# Altium footprint library Connectors SMD.PcbLib: 130 footprints (part 1 of 12)
Each footprint in its own frame and in the unit in brackets; x right, y up, seen from the top. Pads: shape width x height; smd on the part's side, far side on the other; paste and mask are expansions set on the pad; w line width, h text height; cw(c..) or ccw(c..) is an arc to the next point about the centre after c.
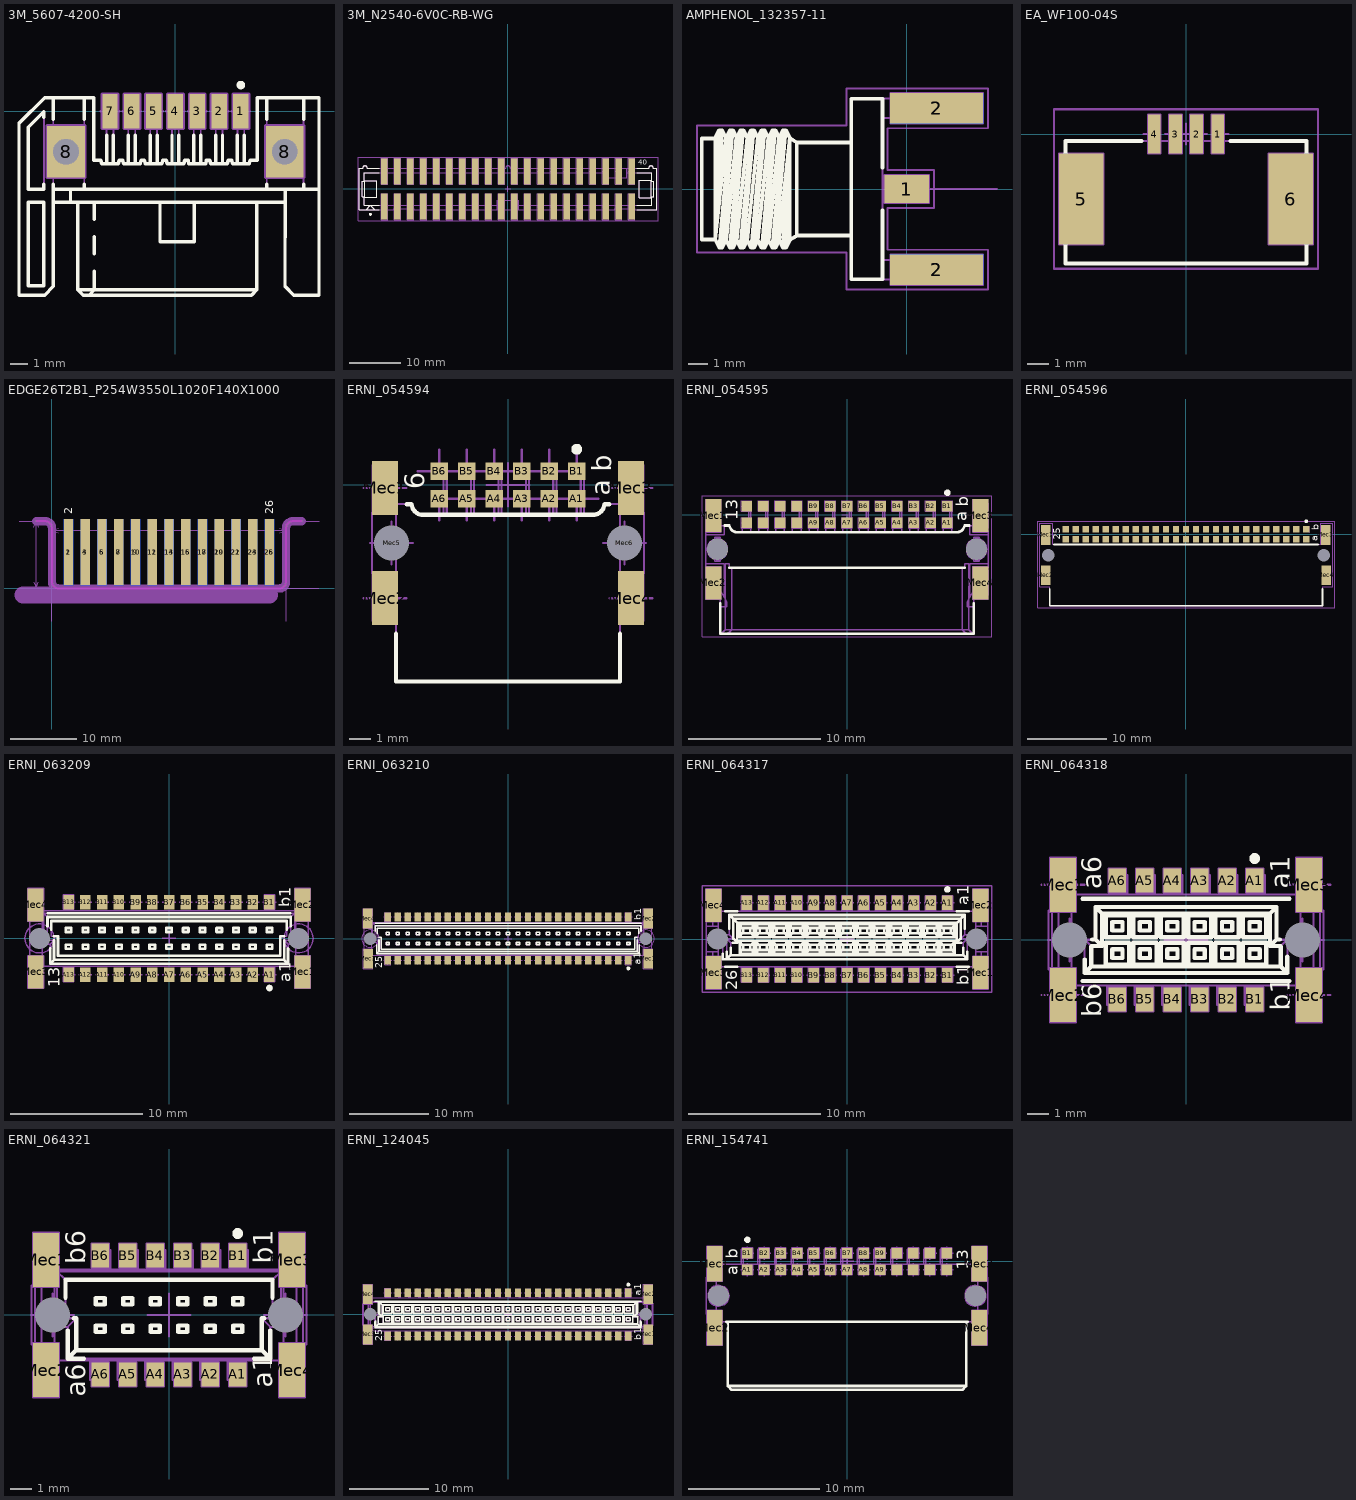
[diagram p0: the footprints below, top view; thin cyan lines are the x and y axes]

## 3M_5607-4200-SH [mm] "1.27mm (.050\") Pitch, Surface Mount, Right Angle, Serial ATA Plug (SATA)"
height 4
pads (9):
  rect 0.9x2 smd: 1(3.81,0) 2(2.54,0) 3(1.27,0) 4(0,0) 5(-1.27,0) 6(-2.54,0) 7(-3.81,0)
  rect 2.2x3 hole 1.5: 8(-6.37,-2.36) 8(6.37,-2.36)
Top Overlay:
  circle w0.25: c3.81,1.516 r0.125
  lines w0.2: -7.66,-4.25 -7.66,-4.559 -8.56,-4.559 -8.56,-0.937 -7.66,-0.037 -7.66,-0.346 ; -7.11,-5.309 6.38,-5.309 ; -7.11,-4.559 8.36,-4.559 ; -7.11,-4.26 -7.11,-10.209 -7.61,-10.709 -9.11,-10.709 -9.11,-0.709 -7.61,0.791 -4.76,0.791 -4.76,-2.859 -4.345,-2.859 -4.296,-3.059 -3.324,-3.059 -3.275,-2.859 -3.075,-2.859 -3.026,-3.059 -2.054,-3.059 -2.005,-2.859 -1.805,-2.859 -1.756,-3.059 -0.784,-3.059 -0.735,-2.859 -0.535,-2.859 -0.486,-3.059 0.486,-3.059 0.535,-2.859 0.735,-2.859 0.784,-3.059 1.756,-3.059 1.805,-2.859 2.005,-2.859 2.054,-3.059 3.026,-3.059 3.075,-2.859 3.275,-2.859 3.324,-3.059 4.296,-3.059 4.345,-2.859 4.76,-2.859 4.76,0.791 8.36,0.791 8.36,-10.709 6.88,-10.709 6.38,-10.209 6.382,-4.569 ; -7.11,-0.46 -7.11,0.791 ; -6.11,-5.309 -6.11,-4.559 ; -5.68,-5.309 -5.68,-10.409 ; -5.31,-4.559 -5.31,-4.26 ; -5.31,-0.46 -5.31,0.791 ; -5.019,-10.709 -4.719,-10.409 -4.719,-9.309 ; -4.719,-8.309 -4.719,-7.309 ; -4.719,-6.309 -4.719,-5.309 ; -4.01,-3.059 -4.01,-1.4 ; -3.61,-3.059 -3.61,-1.4 ; -2.74,-3.059 -2.74,-1.4 ; -2.34,-3.059 -2.34,-1.4 ; -1.47,-3.059 -1.47,-1.4 ; -1.07,-3.059 -1.07,-1.4 ; -0.9,-5.309 -0.9,-7.609 1.1,-7.609 1.1,-5.309 ; -0.2,-3.059 -0.2,-1.4 ; 0.2,-3.059 0.2,-1.4 ; 1.07,-3.059 1.07,-1.4 ; 1.47,-3.059 1.47,-1.4 ; 2.34,-3.059 2.34,-1.4 ; 2.74,-3.059 2.74,-1.4 ; 3.61,-3.059 3.61,-1.4 ; 4.01,-3.059 4.01,-1.4 ; 4.73,-5.309 4.73,-10.409 ; 5.31,-4.559 5.31,-4.26 ; 5.31,-0.46 5.31,0.791 ; 7.46,-4.559 7.46,-4.26 ; 7.46,-0.46 7.46,0.791 ; -5.68,-10.409 -5.38,-10.709 4.43,-10.709 4.73,-10.409 ; -5.68,-10.409 4.73,-10.409 ; -8.56,-10.159 -7.66,-10.159 -7.66,-5.309 -8.56,-5.309 -8.56,-10.159
Mechanical 8:
  circle w0.1: c-6.37,-2.36 r0.75
  circle w0.1: c6.37,-2.36 r0.75
  lines w0.2: -6.87,-2.36 -6.37,-2.36 ; -6.37,-2.86 -6.37,-2.36 ; -6.37,-1.86 -6.37,-2.36 ; -5.87,-2.36 -6.37,-2.36 ; -4.31,0 -3.81,0 ; -3.81,-0.5 -3.81,0 ; -3.81,0.5 -3.81,0 ; -3.31,0 -3.81,0 ; -3.04,0 -2.54,0 ; -2.54,-0.5 -2.54,0 ; -2.54,0.5 -2.54,0 ; -2.04,0 -2.54,0 ; -1.77,0 -1.27,0 ; -1.27,-0.5 -1.27,0 ; -1.27,0.5 -1.27,0 ; -0.77,0 -1.27,0 ; -0.5,0 0,0 ; 0,-0.5 0,0 ; 0,0.5 0,0 ; 0.5,0 0,0 ; 0.77,0 1.27,0 ; 1.27,-0.5 1.27,0 ; 1.27,0.5 1.27,0 ; 1.77,0 1.27,0 ; 2.04,0 2.54,0 ; 2.54,-0.5 2.54,0 ; 2.54,0.5 2.54,0 ; 3.04,0 2.54,0 ; 3.31,0 3.81,0 ; 3.81,-0.5 3.81,0 ; 3.81,0.5 3.81,0 ; 4.31,0 3.81,0 ; 5.87,-2.36 6.37,-2.36 ; 6.37,-2.86 6.37,-2.36 ; 6.37,-1.86 6.37,-2.36 ; 6.87,-2.36 6.37,-2.36 ; -7.47,-3.86 -7.47,-0.86 -5.27,-0.86 -5.27,-3.86 -7.47,-3.86 ; -4.26,-1 -4.26,1 -3.36,1 -3.36,-1 -4.26,-1 ; -2.99,-1 -2.99,1 -2.09,1 -2.09,-1 -2.99,-1 ; -1.72,-1 -1.72,1 -0.82,1 -0.82,-1 -1.72,-1 ; -0.45,-1 -0.45,1 0.45,1 0.45,-1 -0.45,-1 ; 0.82,-1 0.82,1 1.72,1 1.72,-1 0.82,-1 ; 2.09,-1 2.09,1 2.99,1 2.99,-1 2.09,-1 ; 3.36,-1 3.36,1 4.26,1 4.26,-1 3.36,-1 ; 5.27,-3.86 5.27,-0.86 7.47,-0.86 7.47,-3.86 5.27,-3.86
Mechanical 14:
  lines w0.1: -7.11,-5.309 6.38,-5.309 ; -7.11,-4.559 8.36,-4.559 ; -7.11,0.791 -7.11,-10.209 -7.61,-10.709 -9.11,-10.709 -9.11,-0.709 -7.61,0.791 -4.76,0.791 -4.76,-2.859 -4.345,-2.859 -4.296,-3.059 -3.324,-3.059 -3.275,-2.859 -3.075,-2.859 -3.026,-3.059 -2.054,-3.059 -2.005,-2.859 -1.805,-2.859 -1.756,-3.059 -0.784,-3.059 -0.735,-2.859 -0.535,-2.859 -0.486,-3.059 0.486,-3.059 0.535,-2.859 0.735,-2.859 0.784,-3.059 1.756,-3.059 1.805,-2.859 2.005,-2.859 2.054,-3.059 3.026,-3.059 3.075,-2.859 3.275,-2.859 3.324,-3.059 4.296,-3.059 4.345,-2.859 4.76,-2.859 4.76,0.791 8.36,0.791 8.36,-10.709 6.88,-10.709 6.38,-10.209 6.382,-4.569 ; -6.11,-5.309 -6.11,-4.559 ; -5.68,-5.309 -5.68,-10.409 ; -5.31,-4.559 -5.31,0.791 ; -5.019,-10.709 -4.719,-10.409 -4.719,-9.309 ; -4.719,-8.309 -4.719,-7.309 ; -4.719,-6.309 -4.719,-5.309 ; -4.01,-3.059 -4.01,0.591 -3.61,0.591 -3.61,-3.059 ; -2.74,-3.059 -2.74,0.591 -2.34,0.591 -2.34,-3.059 ; -1.47,-3.059 -1.47,0.591 -1.07,0.591 -1.07,-3.059 ; -0.9,-5.309 -0.9,-7.609 1.1,-7.609 1.1,-5.309 ; -0.2,-3.059 -0.2,0.591 0.2,0.591 0.2,-3.059 ; 1.07,-3.059 1.07,0.591 1.47,0.591 1.47,-3.059 ; 2.34,-3.059 2.34,0.591 2.74,0.591 2.74,-3.059 ; 3.61,-3.059 3.61,0.591 4.01,0.591 4.01,-3.059 ; 4.73,-5.309 4.73,-10.409 ; 5.31,-4.559 5.31,0.791 ; 7.46,-4.559 7.46,0.791 ; -5.68,-10.409 -5.38,-10.709 4.43,-10.709 4.73,-10.409 ; -5.68,-10.409 4.73,-10.409 ; -8.56,-10.159 -7.66,-10.159 -7.66,-5.309 -8.56,-5.309 -8.56,-10.159 ; -8.56,-4.559 -7.66,-4.559 -7.66,-0.037 -8.56,-0.937 -8.56,-4.559 ; -6.52,-3.535 -6.22,-3.535 -6.22,-1.177 -6.52,-1.177 -6.52,-3.535 ; 6.22,-3.535 6.52,-3.535 6.52,-1.177 6.22,-1.177 6.22,-3.535
3D body: height 4, standoff -2.7, extent -9.11,-10.709 8.36,0.791

## 3M_N2540-6V0C-RB-WG [mm] "40 Contacts - Straight SMD .100\" x .100\" Low Profile Four-Wall Header"
height 10.16
pads (40):
  rect 1.27x5.08 smd: 1(-24.13,-3.43) 2(-24.13,3.43) 3(-21.59,-3.43) 4(-21.59,3.43) 5(-19.05,-3.43) 6(-19.05,3.43) 7(-16.51,-3.43) 8(-16.51,3.43) 9(-13.97,-3.43) 10(-13.97,3.43) 11(-11.43,-3.43) 12(-11.43,3.43) 13(-8.89,-3.43) 14(-8.89,3.43) 15(-6.35,-3.43) 16(-6.35,3.43) 17(-3.81,-3.43) 18(-3.81,3.43) 19(-1.27,-3.43) 20(-1.27,3.43) 21(1.27,-3.43) 22(1.27,3.43) 23(3.81,-3.43) 24(3.81,3.43) 25(6.35,-3.43) 26(6.35,3.43) 27(8.89,-3.43) 28(8.89,3.43) 29(11.43,-3.43) 30(11.43,3.43) 31(13.97,-3.43) 32(13.97,3.43) 33(16.51,-3.43) 34(16.51,3.43) 35(19.05,-3.43) 36(19.05,3.43) 37(21.59,-3.43) 38(21.59,3.43) 39(24.13,-3.43) 40(24.13,3.43)
Top Overlay:
  circle w0.3: c-26.88,-4.949 r0.15
  lines w0.2: -28.042,-1.599 -25.629,-1.599 -25.629,1.599 -28.042,1.599 ; -27.94,-1.629 -27.94,1.629 ; -27.744,-4.064 -26.88,-3.2 -26.016,-4.064 ; -25.165,-4.064 -29.058,-4.064 -29.058,4.064 -28.397,4.064 cw(c-27.94,4.064) -27.483,4.064 -25.165,4.064 ; -25.165,-3.175 -28.042,-3.175 -28.042,-1.475 -28.448,-1.475 -28.448,1.475 -28.042,1.475 -28.042,3.175 -25.165,3.175 ; 25.165,-4.064 29.058,-4.064 29.058,4.064 28.397,4.064 ccw(c27.94,4.064) 27.483,4.064 25.165,4.064 ; 25.165,-3.175 28.042,-3.175 28.042,-1.524 28.448,-1.524 28.448,1.524 28.042,1.524 28.042,3.175 25.165,3.175 ; 27.94,-1.645 28.042,-1.631 ; 27.94,1.645 28.042,1.631 ; 25.629,-1.664 25.629,1.664 27.94,1.664 27.94,-1.664 25.629,-1.664
  text "40" at 25.453,4.767 h1.02
Mechanical 8:
  drawing of 324 lines, arcs and shapes, not listed
Mechanical 14:
  lines w0.1: -28.042,-1.599 -25.629,-1.599 -25.629,1.599 -28.042,1.599 ; -27.94,-1.629 -27.94,1.629 ; -27.744,-4.064 -26.88,-3.2 -26.016,-4.064 ; -3.365,-4.064 -3.365,-3.175 ; -2.095,-4.064 -2.095,-2.159 2.096,-2.159 2.096,-4.064 ; -2.095,-3.175 -28.042,-3.175 -28.042,-1.475 -28.448,-1.475 -28.448,1.475 -28.042,1.475 -28.042,3.175 18.979,3.175 18.987,3.175 ; -1.46,-4.064 -1.46,-2.159 ; 1.461,-4.064 1.461,-2.159 ; 2.096,-3.175 28.042,-3.175 28.042,-1.524 28.448,-1.524 28.448,1.524 28.042,1.524 28.042,3.175 23.178,3.175 ; 3.366,-4.064 3.366,-3.175 ; 18.987,4.064 18.987,2.159 23.178,2.159 23.178,4.064 ; 19.622,2.159 19.622,4.064 ; 24.448,3.175 24.448,4.064 ; 27.94,-1.645 28.042,-1.631 ; 27.94,1.645 28.042,1.631 ; -29.058,-4.064 -22.352,-4.064 -22.352,-3.81 -18.288,-3.81 -18.288,-4.064 20.828,-4.064 20.828,-3.81 24.892,-3.81 24.892,-4.064 29.058,-4.064 29.058,4.064 28.397,4.064 ccw(c27.94,4.064) 27.483,4.064 14.427,4.064 ccw(c13.97,4.064) 13.513,4.064 0.457,4.064 ccw(c0,4.064) -0.457,4.064 -13.513,4.064 ccw(c-13.97,4.064) -14.427,4.064 -27.483,4.064 ccw(c-27.94,4.064) -28.397,4.064 -29.058,4.064 -29.058,-4.064 ; 25.629,-1.664 25.629,1.664 27.94,1.664 27.94,-1.664 25.629,-1.664
  text "40" at 25.453,4.767 h1.02
Mechanical 15:
  lines w0.05: -29.308,-6.22 -29.308,6.22 29.308,6.22 29.308,-6.22 -29.308,-6.22
3D body: height 10.16, standoff 0, extent -29.057,-5.588 29.058,5.588

## AMPHENOL_132357-11 [mm] "SMA End Launch Jack for 1.58mm PCB, 50 Ohm, Flat Tab Contact"
height 7.92
pads (5):
  rect 2.35x1.5 smd: 1(0,0)
  rect 4.9x1.6 smd: 2(1.575,-4.25) 2(1.575,4.25)
  rect 4.9x1.6 smd far side: 2(1.575,-4.25) 2(1.575,4.25)
Top Overlay:
  lines w0.2: -10.09,2.665 -10.805,2.665 -10.805,-2.665 -10.09,-2.665 ; -6.17,-2.665 -5.795,-2.453 ; -2.925,-2.453 -5.795,-2.453 ; -2.925,2.447 -5.795,2.447 ; -1.275,-1.137 -1.275,-4.76 -2.925,-4.76 -2.925,4.76 -1.275,4.76 -1.275,1.137 ; -10.09,-2.665 -9.879,3.094 ; -10.09,-2.665 -9.741,3.094 ; -10.09,-2.665 -9.53,2.715 ; -10.09,-2.665 -9.879,-3.094 ; -10.09,-2.665 -10.09,2.715 -9.879,3.094 ; -9.879,-3.094 -9.319,3.094 ; -9.879,-3.094 -9.741,-3.094 ; -9.879,3.094 -9.741,3.094 ; -9.741,-3.094 -9.181,3.094 ; -9.741,-3.094 -9.53,-2.715 ; -9.741,3.094 -9.53,2.715 ; -9.53,-2.715 -8.97,2.715 ; -9.53,-2.715 -9.319,-3.094 ; -9.53,2.715 -9.319,3.094 ; -9.319,-3.094 -8.759,3.094 ; -9.319,-3.094 -9.181,-3.094 ; -9.319,3.094 -9.181,3.094 ; -9.181,-3.094 -8.621,3.094 ; -9.181,-3.094 -8.97,-2.715 ; -9.181,3.094 -8.97,2.715 ; -8.97,-2.715 -8.41,2.715 ; -8.97,-2.715 -8.759,-3.094 ; -8.97,2.715 -8.759,3.094 ; -8.759,-3.094 -8.199,3.094 ; -8.759,-3.094 -8.621,-3.094 ; -8.759,3.094 -8.621,3.094 ; -8.621,-3.094 -8.061,3.094 ; -8.621,-3.094 -8.41,-2.715 ; -8.621,3.094 -8.41,2.715 ; -8.41,-2.715 -7.85,2.715 ; -8.41,-2.715 -8.199,-3.094 ; -8.41,2.715 -8.199,3.094 ; -8.199,-3.094 -7.639,3.094 ; -8.199,-3.094 -8.061,-3.094 ; -8.199,3.094 -8.061,3.094 ; -8.061,-3.094 -7.501,3.094 ; -8.061,-3.094 -7.85,-2.715 ; -8.061,3.094 -7.85,2.715 ; -7.85,-2.715 -7.29,2.715 ; -7.85,-2.715 -7.639,-3.094 ; -7.85,2.715 -7.639,3.094 ; -7.639,-3.094 -7.079,3.094 ; -7.639,-3.094 -7.501,-3.094 ; -7.639,3.094 -7.501,3.094 ; -7.501,-3.094 -6.941,3.094 ; -7.501,-3.094 -7.29,-2.715 ; -7.501,3.094 -7.29,2.715 ; -7.29,-2.715 -6.73,2.715 ; -7.29,-2.715 -7.079,-3.094 ; -7.29,2.715 -7.079,3.094 ; -7.079,-3.094 -6.519,3.094 ; -7.079,-3.094 -6.941,-3.094 ; -7.079,3.094 -6.941,3.094 ; -6.941,-3.094 -6.381,3.094 ; -6.941,-3.094 -6.73,-2.715 ; -6.941,3.094 -6.73,2.715 ; -6.73,-2.715 -6.17,2.713 ; -6.73,-2.715 -6.519,-3.094 ; -6.73,2.715 -6.519,3.094 ; -6.519,-3.094 -6.17,2.713 ; -6.519,-3.094 -6.381,-3.094 ; -6.519,3.094 -6.381,3.094 ; -6.381,-3.094 -6.17,2.665 -5.795,2.447 ; -6.381,-3.094 -6.17,-2.715 -6.17,2.713 ; -6.381,3.094 -6.17,2.713 ; -5.795,-2.453 -5.795,2.447
Mechanical 8:
  lines w0.1: -0.5,0 0,0 ; 0,-0.5 0,0 ; 0,0.5 0,0 ; 0.5,0 0,0 ; 1.075,-4.25 1.575,-4.25 ; 1.075,4.25 1.575,4.25 ; 1.575,-4.75 1.575,-4.25 ; 1.575,-3.75 1.575,-4.25 ; 1.575,3.75 1.575,4.25 ; 1.575,4.75 1.575,4.25 ; 2.075,-4.25 1.575,-4.25 ; 2.075,4.25 1.575,4.25 ; -1.175,-0.75 1.175,-0.75 1.175,0.75 -1.175,0.75 -1.175,-0.75 ; -0.875,-5.05 -0.875,-3.45 4.025,-3.45 4.025,-5.05 -0.875,-5.05 ; -0.875,3.45 -0.875,5.05 4.025,5.05 4.025,3.45 -0.875,3.45
Mechanical 14:
  lines w0.1: -10.09,2.665 -10.805,2.665 -10.805,-2.665 -10.09,-2.665 ; -6.17,-2.665 -5.795,-2.453 ; -2.925,-2.453 -5.795,-2.453 ; -2.925,2.447 -5.795,2.447 ; -1.275,-4.76 -1.275,0 ; -1.275,-3.74 3.475,-3.74 3.475,-4.76 -2.925,-4.76 -2.925,4.76 3.475,4.76 3.475,3.74 -1.275,3.74 ; -1.275,-0.251 0.635,-0.251 0.635,0.251 -1.275,0.251 ; -1.275,4.76 -1.275,0 ; 4.75,0 -1.275,0 ; -10.09,-2.665 -9.879,3.094 ; -10.09,-2.665 -9.741,3.094 ; -10.09,-2.665 -9.53,2.715 ; -10.09,-2.665 -9.879,-3.094 ; -10.09,-2.665 -10.09,2.715 -9.879,3.094 ; -9.879,-3.094 -9.319,3.094 ; -9.879,-3.094 -9.741,-3.094 ; -9.879,3.094 -9.741,3.094 ; -9.741,-3.094 -9.181,3.094 ; -9.741,-3.094 -9.53,-2.715 ; -9.741,3.094 -9.53,2.715 ; -9.53,-2.715 -8.97,2.715 ; -9.53,-2.715 -9.319,-3.094 ; -9.53,2.715 -9.319,3.094 ; -9.319,-3.094 -8.759,3.094 ; -9.319,-3.094 -9.181,-3.094 ; -9.319,3.094 -9.181,3.094 ; -9.181,-3.094 -8.621,3.094 ; -9.181,-3.094 -8.97,-2.715 ; -9.181,3.094 -8.97,2.715 ; -8.97,-2.715 -8.41,2.715 ; -8.97,-2.715 -8.759,-3.094 ; -8.97,2.715 -8.759,3.094 ; -8.759,-3.094 -8.199,3.094 ; -8.759,-3.094 -8.621,-3.094 ; -8.759,3.094 -8.621,3.094 ; -8.621,-3.094 -8.061,3.094 ; -8.621,-3.094 -8.41,-2.715 ; -8.621,3.094 -8.41,2.715 ; -8.41,-2.715 -7.85,2.715 ; -8.41,-2.715 -8.199,-3.094 ; -8.41,2.715 -8.199,3.094 ; -8.199,-3.094 -7.639,3.094 ; -8.199,-3.094 -8.061,-3.094 ; -8.199,3.094 -8.061,3.094 ; -8.061,-3.094 -7.501,3.094 ; -8.061,-3.094 -7.85,-2.715 ; -8.061,3.094 -7.85,2.715 ; -7.85,-2.715 -7.29,2.715 ; -7.85,-2.715 -7.639,-3.094 ; -7.85,2.715 -7.639,3.094 ; -7.639,-3.094 -7.079,3.094 ; -7.639,-3.094 -7.501,-3.094 ; -7.639,3.094 -7.501,3.094 ; -7.501,-3.094 -6.941,3.094 ; -7.501,-3.094 -7.29,-2.715 ; -7.501,3.094 -7.29,2.715 ; -7.29,-2.715 -6.73,2.715 ; -7.29,-2.715 -7.079,-3.094 ; -7.29,2.715 -7.079,3.094 ; -7.079,-3.094 -6.519,3.094 ; -7.079,-3.094 -6.941,-3.094 ; -7.079,3.094 -6.941,3.094 ; -6.941,-3.094 -6.381,3.094 ; -6.941,-3.094 -6.73,-2.715 ; -6.941,3.094 -6.73,2.715 ; -6.73,-2.715 -6.17,2.713 ; -6.73,-2.715 -6.519,-3.094 ; -6.73,2.715 -6.519,3.094 ; -6.519,-3.094 -6.17,2.713 ; -6.519,-3.094 -6.381,-3.094 ; -6.519,3.094 -6.381,3.094 ; -6.381,-3.094 -6.17,2.665 -5.795,2.447 ; -6.381,-3.094 -6.17,-2.715 -6.17,2.713 ; -6.381,3.094 -6.17,2.713 ; -5.795,-2.453 -5.795,2.447
Mechanical 15:
  lines w0.1: -11.055,-3.344 -11.055,3.344 -3.175,3.344 -3.175,5.3 4.275,5.3 4.275,3.2 -1.025,3.2 -1.025,1 1.425,1 1.425,-1 -1.025,-1 -1.025,-3.2 4.275,-3.2 4.275,-5.3 -3.175,-5.3 -3.175,-3.344 -11.055,-3.344
3D body: height 4.08, standoff -3.84, extent -10.805,-4.76 3.475,4.76

## EA_WF100-04S [mm] "4 Contact Picth 1mm, ZIF Connector For Touch Panel"
height 3
pads (6):
  rect 0.6x1.85 smd: 1(1.5,0) 2(0.5,0) 3(-0.5,0) 4(-1.5,0)
  rect 2.1x4.3 smd: 5(-4.95,-3.075) 6(4.95,-3.075)
Top Overlay:
  lines w0.2: -2.1,-0.325 -5.7,-0.325 -5.7,-6.125 5.7,-6.125 5.7,-0.325 2.1,-0.325
Mechanical 8:
  lines w0.1: -5.45,-3.075 -4.95,-3.075 ; -4.95,-3.575 -4.95,-3.075 ; -4.95,-2.575 -4.95,-3.075 ; -4.45,-3.075 -4.95,-3.075 ; -2,0 -1.5,0 ; -1.5,-0.5 -1.5,0 ; -1.5,0.5 -1.5,0 ; -1,0 -0.5,0 ; -0.5,-0.5 -0.5,0 ; -0.5,0.5 -0.5,0 ; 0,-0.5 0,0 ; 0,0.5 0,0 ; 0.5,-0.5 0.5,0 ; 0.5,0.5 0.5,0 ; 1,0 0.5,0 ; 1.5,-0.5 1.5,0 ; 1.5,0.5 1.5,0 ; 2,0 1.5,0 ; 4.45,-3.075 4.95,-3.075 ; 4.95,-3.575 4.95,-3.075 ; 4.95,-2.575 4.95,-3.075 ; 5.45,-3.075 4.95,-3.075 ; -0.5,0 0,0 ; 0,0 0.5,0 ; -6,-5.225 -6,-0.925 -3.9,-0.925 -3.9,-5.225 -6,-5.225 ; -1.8,-0.925 -1.8,0.925 -1.2,0.925 -1.2,-0.925 -1.8,-0.925 ; -0.8,-0.925 -0.8,0.925 -0.2,0.925 -0.2,-0.925 -0.8,-0.925 ; 0.2,-0.925 0.2,0.925 0.8,0.925 0.8,-0.925 0.2,-0.925 ; 1.2,-0.925 1.2,0.925 1.8,0.925 1.8,-0.925 1.2,-0.925 ; 3.9,-5.225 6,-5.225 6,-0.925 3.9,-0.925 3.9,-5.225
Mechanical 14:
  lines w0.1: -5.7,-6.125 -5.7,-0.325 5.7,-0.325 5.7,-6.125 -5.7,-6.125
Mechanical 15:
  lines w0.1: -6.25,-6.375 6.25,-6.375 6.25,1.175 -6.25,1.175 -6.25,-6.375
3D body: height 3, standoff 0, extent -5.7,-6.125 5.7,-0.325

## EDGE26T2B1_P254W3550L1020F140X1000 [mm] "26 contacts Board Eddge Connector, First Left Top Pad 2, First Left Bottom Pad 1Pitch 2.54mm Length 35.5mm, Width 10.2mm, Finger Lenght 10mm, Finger Witdth 1.4mm"
pads (26):
  rect 1.4x10 smd far side: 1(2.51,5.5) 3(5.05,5.5) 5(7.59,5.5) 7(10.13,5.5) 9(12.67,5.5) 11(15.21,5.5) 13(17.75,5.5) 15(20.29,5.5) 17(22.83,5.5) 19(25.37,5.5) 21(27.91,5.5) 23(30.45,5.5) 25(32.99,5.5)
  rect 1.4x10 smd: 2(2.51,5.5) 4(5.05,5.5) 6(7.59,5.5) 8(10.13,5.5) 10(12.67,5.5) 12(15.21,5.5) 14(17.75,5.5) 16(20.29,5.5) 18(22.83,5.5) 20(25.37,5.5) 22(27.91,5.5) 24(30.45,5.5) 26(32.99,5.5)
Top Overlay:
  text "2" at 3.1,11.225 h1.2
  text "26" at 33.58,11.225 h1.2
Bottom Overlay:
  text "1" at 1.9,11.35 h1.2
  text "25" at 32.38,11.35 h1.2
Top Solder:
  rectangle: 0,-2.275 35.5,10.5
  lines w2.54: -4.425,-1 32.99,-1
Bottom Solder:
  rectangle: 0,-2.275 35.5,10.5
  lines w2.54: -4.425,-1 32.99,-1
Keep-Out Layer:
  lines w0.305: -2.4,10.2 -1,10.2 cw(c-1,9.2) 0,9.2 0,1 ccw(c1,1) 1,0 34.5,0 ccw(c34.5,1) 35.5,1 35.5,9.2 cw(c36.5,9.2) 36.5,10.2 37.9,10.2
Mechanical 1:
  lines w1.27: -2.4,10.2 -1,10.2 cw(c-1,9.2) 0,9.2 0,1 ccw(c1,1) 1,0 34.5,0 ccw(c34.5,1) 35.5,1 35.5,9.2 cw(c36.5,9.2) 36.5,10.2 37.9,10.2
Corners:
  lines w0.1: -5,0 0,0 0,-5 ; 35.5,-5 35.5,0 40.5,0
Mechanical 8:
  lines w0.1: -5,0 0,0 0,-5 ; -5,10.2 -1,10.2 ; -3.8,0 -2.4,0 ; -3.8,10.2 -2.4,10.2 ; -2.742,0.94 -2.4,0 ; -2.742,9.26 -2.4,10.2 ; -2.058,0.94 -2.4,0 ; -2.058,9.26 -2.4,10.2 ; -1,0 -2.4,0 ; 0.94,8.458 0,8.8 ; 0.94,9.142 0,8.8 ; 34.56,8.458 35.5,8.8 ; 34.56,9.142 35.5,8.8 ; 35.5,-5 35.5,0 40.5,0 ; 40.5,10.2 36.5,10.2 ccw(c36.5,9.2) 35.5,9.2 ; -2.4,0 -2.4,10.2 ; -2.4,10.2 -1,10.2 ; -1,10.2 cw(c-1,9.2) 0,9.2 ; 0,8.8 0,9.2 ; 0,8.8 35.5,8.8 ; 0,9.2 0,1 ccw(c1,1) 1,0 34.5,0 ccw(c34.5,1) 35.5,1 35.5,9.2 ; 2.51,5.5 2.51,6 2.51,5.5 ; 2.51,5.5 2.51,5 2.51,5.5 ; 2.51,5.5 3.01,5.5 2.51,5.5 ; 2.51,5.5 2.01,5.5 2.51,5.5 ; 5.05,5.5 5.05,6 5.05,5.5 ; 5.05,5.5 5.05,5 5.05,5.5 ; 5.05,5.5 5.55,5.5 5.05,5.5 ; 5.05,5.5 4.55,5.5 5.05,5.5 ; 7.59,5.5 7.59,6 7.59,5.5 ; 7.59,5.5 7.59,5 7.59,5.5 ; 7.59,5.5 8.09,5.5 7.59,5.5 ; 7.59,5.5 7.09,5.5 7.59,5.5 ; 10.13,5.5 10.13,6 10.13,5.5 ; 10.13,5.5 10.13,5 10.13,5.5 ; 10.13,5.5 10.63,5.5 10.13,5.5 ; 10.13,5.5 9.63,5.5 10.13,5.5 ; 12.67,5.5 12.67,6 12.67,5.5 ; 12.67,5.5 12.67,5 12.67,5.5 ; 12.67,5.5 13.17,5.5 12.67,5.5 ; 12.67,5.5 12.17,5.5 12.67,5.5 ; 15.21,5.5 15.21,6 15.21,5.5 ; 15.21,5.5 15.21,5 15.21,5.5 ; 15.21,5.5 15.71,5.5 15.21,5.5 ; 15.21,5.5 14.71,5.5 15.21,5.5 ; 17.75,5.5 17.75,6 17.75,5.5 ; 17.75,5.5 17.75,5 17.75,5.5 ; 17.75,5.5 18.25,5.5 17.75,5.5 ; 17.75,5.5 17.25,5.5 17.75,5.5 ; 20.29,5.5 20.29,6 20.29,5.5 ; 20.29,5.5 20.29,5 20.29,5.5 ; 20.29,5.5 20.79,5.5 20.29,5.5 ; 20.29,5.5 19.79,5.5 20.29,5.5 ; 22.83,5.5 22.83,6 22.83,5.5 ; 22.83,5.5 22.83,5 22.83,5.5 ; 22.83,5.5 23.33,5.5 22.83,5.5 ; 22.83,5.5 22.33,5.5 22.83,5.5 ; 25.37,5.5 25.37,6 25.37,5.5 ; 25.37,5.5 25.37,5 25.37,5.5 ; 25.37,5.5 25.87,5.5 25.37,5.5 ; 25.37,5.5 24.87,5.5 25.37,5.5 ; 27.91,5.5 27.91,6 27.91,5.5 ; 27.91,5.5 27.91,5 27.91,5.5 ; 27.91,5.5 28.41,5.5 27.91,5.5 ; 27.91,5.5 27.41,5.5 27.91,5.5 ; 30.45,5.5 30.45,6 30.45,5.5 ; 30.45,5.5 30.45,5 30.45,5.5 ; 30.45,5.5 30.95,5.5 30.45,5.5 ; 30.45,5.5 29.95,5.5 30.45,5.5 ; 32.99,5.5 32.99,6 32.99,5.5 ; 32.99,5.5 32.99,5 32.99,5.5 ; 32.99,5.5 33.49,5.5 32.99,5.5 ; 32.99,5.5 32.49,5.5 32.99,5.5 ; 35.5,8.8 35.5,9.2
  text "All Pads  W 1.4mm x L 10mm" at 4.5,6.85 h1.2
  text "10.2mm" at -3.125,1.425 h1.2
  text "35.5mm" at 15.3,9.45 h1.2
Plating Frame:
  lines w0.305: 2.51,-1 2.51,5.5 ; 5.05,-1 5.05,5.5 ; 7.59,-1 7.59,5.5 ; 10.13,-1 10.13,5.5 ; 12.67,-1 12.67,5.5 ; 15.21,-1 15.21,5.5 ; 17.75,-1 17.75,5.5 ; 20.29,-1 20.29,5.5 ; 22.83,-1 22.83,5.5 ; 25.37,-1 25.37,5.5 ; 27.91,-1 27.91,5.5 ; 30.45,-1 30.45,5.5 ; 32.99,-1 32.99,5.5
  lines w2.54: -4.425,-1 32.99,-1
Drill Drawing:
  lines w0.1: -2.4,10.2 -1,10.2 cw(c-1,9.2) 0,9.2 0,7.8 ; 0,1 ccw(c1,1) 1,0 ; 18.125,1.737 33.762,1.737 35.25,0.25 ; 34.344,0.673 35.25,0.25 ; 34.5,0 ccw(c34.5,1) 35.5,1 ; 34.827,1.156 35.25,0.25 ; 35.5,7.8 35.5,9.2 cw(c36.5,9.2) 36.5,10.2 37.9,10.2
  text "4 x r = 1mm max" at 17.7,2.25 h1.2

## ERNI_054594 [mm] "12 Contacts Pitch 1.27  SMC Right Angle Male Connector Type B"
height 4.2
pads (18):
  rect 0.8x0.8 smd: A1(3.175,-0.635) A2(1.905,-0.635) A3(0.635,-0.635) A4(-0.635,-0.635) A5(-1.905,-0.635) A6(-3.175,-0.635) B1(3.175,0.635) B2(1.905,0.635) B3(0.635,0.635) B4(-0.635,0.635) B5(-1.905,0.635) B6(-3.175,0.635)
  rect 1.2x2.5 smd: Mec1(-5.685,-0.135) Mec2(-5.685,-5.235) Mec3(5.685,-0.135) Mec4(5.685,-5.235)
  round 1 hole 1.6 unplated mask+0.4: Mec5(-5.385,-2.685) Mec6(5.385,-2.685)
Top Overlay:
  circle w0.25: c3.175,1.651 r0.125
  lines w0.2: -5.175,-6.885 -5.175,-9.085 5.175,-9.085 5.175,-6.885 ; -4.685,-0.885 -4.475,-0.885 -4.413,-1.055 ccw(c-3.942,-0.884) -3.941,-1.385 3.941,-1.385 ccw(c3.942,-0.884) 4.413,-1.054 4.475,-0.885 4.685,-0.885
  text "a" at 4.725,-0.5 h0.9
  text "b" at 4.78,0.6 h0.9
  text "6" at -3.875,-0.2 h0.9
Mechanical 8:
  lines w0.1: -6.685,-5.235 -5.685,-5.235 ; -6.685,-0.135 -5.685,-0.135 ; -6.385,-2.685 -5.385,-2.685 ; -5.685,-6.235 -5.685,-5.235 ; -5.685,-4.235 -5.685,-5.235 ; -5.685,-1.135 -5.685,-0.135 ; -5.685,0.865 -5.685,-0.135 ; -5.385,-3.685 -5.385,-2.685 ; -5.385,-1.685 -5.385,-2.685 ; -4.685,-5.235 -5.685,-5.235 ; -4.685,-0.135 -5.685,-0.135 ; -4.385,-2.685 -5.385,-2.685 ; -4.175,0.635 -3.175,0.635 -3.175,1.635 ; -3.175,-1.635 -3.175,-0.635 -2.175,-0.635 ; -2.905,0.635 -1.905,0.635 -1.905,1.635 ; -1.905,-1.635 -1.905,-0.635 -0.905,-0.635 ; -1.635,0.635 -0.635,0.635 -0.635,1.635 ; -1,0 0,0 ; -0.635,-1.635 -0.635,-0.635 0.365,-0.635 ; -0.365,0.635 0.635,0.635 0.635,1.635 ; 0,-1 0,0 ; 0,1 0,0 ; 0.635,-1.635 0.635,-0.635 1.635,-0.635 ; 0.905,0.635 1.905,0.635 1.905,1.635 ; 1,0 0,0 ; 1.905,-1.635 1.905,-0.635 2.905,-0.635 ; 2.175,0.635 3.175,0.635 3.175,1.635 ; 3.175,-1.635 3.175,-0.635 4.175,-0.635 ; 4.385,-2.685 5.385,-2.685 ; 4.685,-5.235 5.685,-5.235 ; 4.685,-0.135 5.685,-0.135 ; 5.385,-3.685 5.385,-2.685 ; 5.385,-1.685 5.385,-2.685 ; 5.685,-6.235 5.685,-5.235 ; 5.685,-4.235 5.685,-5.235 ; 5.685,-1.135 5.685,-0.135 ; 5.685,0.865 5.685,-0.135 ; 6.385,-2.685 5.385,-2.685 ; 6.685,-5.235 5.685,-5.235 ; 6.685,-0.135 5.685,-0.135
Mechanical 14:
  lines w0.1: -5.585,-4.135 -6.255,-4.135 -6.255,-6.285 -5.255,-6.285 -5.255,-5.785 -5.255,-5.485 ; -5.585,-4.085 -5.585,-5.485 -5.185,-5.485 -5.185,0.115 -5.255,0.115 ; -5.585,-1.285 -5.585,0.115 -5.255,0.115 ; -5.585,-1.235 -6.255,-1.235 -6.255,0.915 -5.255,0.915 -5.255,0.115 ; -5.185,-4.085 -6.285,-4.085 -6.285,-1.285 -5.185,-1.285 ; -3.345,-0.838 -3.345,-0.538 ; -3.345,0.433 -3.345,0.733 ; -3.245,-0.938 -2.985,-0.938 ; -3.245,-0.438 -2.985,-0.438 ; -3.245,0.333 -2.985,0.333 ; -3.245,0.833 -2.985,0.833 ; -2.985,-1.385 -2.985,0.833 ; -2.835,-1.385 -2.835,0.833 -2.985,0.833 ; -2.075,-0.838 -2.075,-0.538 ; -2.075,0.433 -2.075,0.733 ; -1.975,-0.938 -1.715,-0.938 ; -1.975,-0.438 -1.715,-0.438 ; -1.975,0.333 -1.715,0.333 ; -1.975,0.833 -1.715,0.833 ; -1.715,-1.385 -1.715,0.833 ; -1.565,-1.385 -1.565,0.833 -1.715,0.833 ; -0.805,-0.838 -0.805,-0.538 ; -0.805,0.433 -0.805,0.733 ; -0.705,-0.938 -0.445,-0.938 ; -0.705,-0.438 -0.445,-0.438 ; -0.705,0.333 -0.445,0.333 ; -0.705,0.833 -0.445,0.833 ; -0.445,-1.385 -0.445,0.833 ; -0.295,-1.385 -0.295,0.833 -0.445,0.833 ; 0.465,-0.838 0.465,-0.538 ; 0.465,0.433 0.465,0.733 ; 0.565,-0.938 0.825,-0.938 ; 0.565,-0.438 0.825,-0.438 ; 0.565,0.333 0.825,0.333 ; 0.565,0.833 0.825,0.833 ; 0.825,-1.385 0.825,0.833 ; 0.975,-1.385 0.975,0.833 0.825,0.833 ; 1.735,-0.838 1.735,-0.538 ; 1.735,0.433 1.735,0.733 ; 1.835,-0.938 2.095,-0.938 ; 1.835,-0.438 2.095,-0.438 ; 1.835,0.333 2.095,0.333 ; 1.835,0.833 2.095,0.833 ; 2.095,-1.385 2.095,0.833 ; 2.245,-1.385 2.245,0.833 2.095,0.833 ; 3.005,-0.838 3.005,-0.538 ; 3.005,0.433 3.005,0.733 ; 3.105,-0.938 3.365,-0.938 ; 3.105,-0.438 3.365,-0.438 ; 3.105,0.333 3.365,0.333 ; 3.105,0.833 3.365,0.833 ; 3.365,-1.385 3.365,0.833 ; 3.515,-1.385 3.515,0.833 3.365,0.833 ; 5.185,-4.085 6.285,-4.085 6.285,-1.285 5.185,-1.285 ; 5.255,-5.485 5.255,-5.785 5.255,-6.285 6.255,-6.285 6.255,-4.135 5.585,-4.135 ; 5.585,-4.085 5.585,-5.485 5.185,-5.485 5.185,0.115 5.255,0.115 ; 5.585,-1.285 5.585,0.115 5.255,0.115 ; 5.585,-1.235 6.255,-1.235 6.255,0.915 5.255,0.915 5.255,0.115 ; -5.175,-9.085 5.175,-9.085 5.175,-0.885 4.475,-0.885 4.413,-1.054 cw(c3.942,-0.884) 3.941,-1.385 -3.941,-1.385 cw(c-3.942,-0.884) -4.413,-1.055 -4.475,-0.885 -5.175,-0.885 -5.175,-9.085